# Altium footprint library custom-case.PcbLib: 380 footprints (part 1 of 24)
Each footprint in its own frame and in the unit in brackets; x right, y up, seen from the top. Pads: shape width x height; smd on the part's side, far side on the other; paste and mask are expansions set on the pad; w line width, h text height; cw(c..) or ccw(c..) is an arc to the next point about the centre after c.
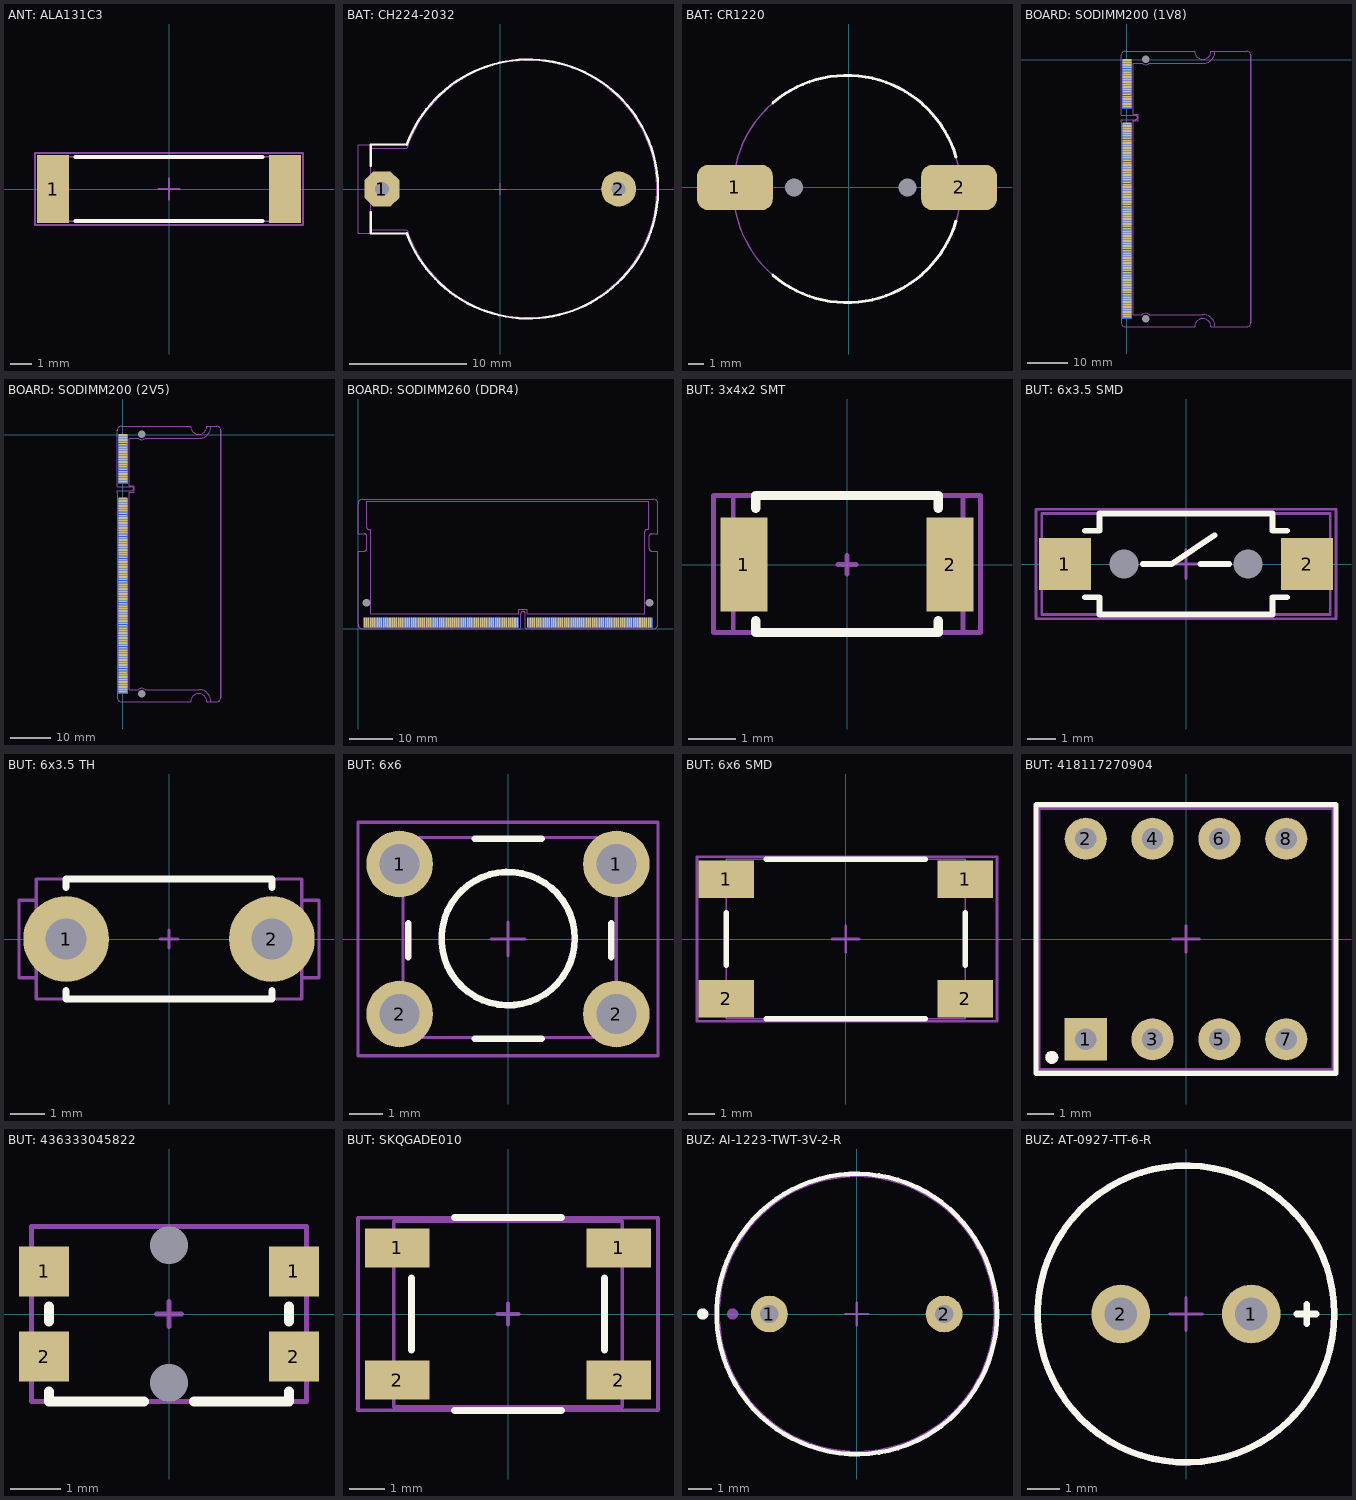
[diagram p0: the footprints below, top view; thin cyan lines are the x and y axes]

## ANT: ALA131C3 [mm]
pads (2):
  rect 1.5x3.2 smd: 1(-5.45,0) ""(5.45,0)
Top Overlay:
  lines w0.2: -4.4,-1.5 4.4,-1.5 ; -4.4,1.5 4.4,1.5
Top Assy:
  lines w0.1: -5.5,-1.525 5.5,-1.5 5.5,1.525 -5.5,1.5 -5.5,-1.525
Size Area:
  lines w0.1: -0.5,0 0.5,0 ; 0,-0.5 0,0.5 ; -6.3,-1.7 6.3,-1.7 6.3,1.7 -6.3,1.7 -6.3,-1.7
3D body "Antenna ALA131C3.STEP": height 1.22, standoff -0.02, extent -5.5,-1.52 5.5,1.52

## BAT: CH224-2032 [mm] "пїЅпїЅпїЅпїЅпїЅпїЅпїЅпїЅпїЅпїЅ пїЅпїЅпїЅпїЅпїЅ пїЅпїЅпїЅ пїЅпїЅпїЅпїЅпїЅпїЅпїЅпїЅ 2032"
height 9
pads (2):
  oct 3x3 hole 1.2: 1(-10.151,0)
  round 3 hole 1.2: 2(10.152,0)
Top Overlay:
  lines w0.2: -11.1,-2 -11.1,-3.81 -8.01,-3.81 ; -11.1,2 -11.1,3.81 -8.025,3.81 ; -8.01,-3.794 ccw(c2.422,0) -8.007,3.803
Top Assy:
  lines w0.1: -7.992,-3.5 -11.1,-3.5 -11.1,3.5 -7.992,3.5 ; -7.989,-3.552 ccw(c2.422,0) -7.989,3.552
Size Area:
  lines w0.1: -8.255,-3.81 -12.192,-3.81 -12.192,3.81 -8.255,3.81 ; -8.01,3.794 cw(c2.422,0) -8.005,-3.808 ; -0.5,0 0.5,0 ; 0,-0.5 0,0.5
3D body "CH224-2032.step": height 8.5, standoff -4, extent -11.079,-11 13.421,11

## BAT: CR1220 [mm]
pads (4):
  rrect50% 5x3 smd mask+0.075: 1(-7.5,0) 2(7.3,0)
  round 0 hole 1.2 mask+0.075: MH(-3.6,0) MH(3.9,0)
Top Overlay:
  lines w0.2: -4.997,-5.781 ccw(c-0.1,-0.1) 7.1,-2.2 ; -4.997,5.581 cw(c-0.1,-0.1) 7.1,2
Top Assy:
  lines w0.1: -5.002,-5.776 cw(c-0.1,-0.1) -4.997,-5.781
3D body "User Library-CR1220-2.STEP": height 3.6, standoff 1.6, extent -6.175,-6.175 6.225,6.225
3D body "ALSRobot-CR1220.STEP": height 4.04, standoff -0.9, extent -9.35,-7.6 9.15,7.397

## BOARD: SODIMM200 (1V8) [mm]
pads (202):
  rect 2.3x0.45 smd: 1(0,0) 3(0,-0.6) 5(0,-1.2) 7(0,-1.8) 9(0,-2.4) 11(0,-3) 13(0,-3.6) 15(0,-4.2) 17(0,-4.8) 19(0,-5.4) 21(0,-6) 23(0,-6.6) 25(0,-7.2) 27(0,-7.8) 29(0,-8.4) 31(0,-9) 33(0,-9.6) 35(0,-10.2) 37(0,-10.8) 39(0,-11.4) 41(0,-15.6) 43(0,-16.2) 45(0,-16.8) 47(0,-17.4) 49(0,-18) 51(0,-18.6) 53(0,-19.2) 55(0,-19.8) 57(0,-20.4) 59(0,-21) 61(0,-21.6) 63(0,-22.2) 65(0,-22.8) 67(0,-23.4) 69(0,-24) 71(0,-24.6) 73(0,-25.2) 75(0,-25.8) 77(0,-26.4) 79(0,-27) 81(0,-27.6) 83(0,-28.2) 85(0,-28.8) 87(0,-29.4) 89(0,-30) 91(0,-30.6) 93(0,-31.2) 95(0,-31.8) 97(0,-32.4) 99(0,-33) 101(0,-33.6) 103(0,-34.2) 105(0,-34.8) 107(0,-35.4) 109(0,-36) 111(0,-36.6) 113(0,-37.2) 115(0,-37.8) 117(0,-38.4) 119(0,-39) 121(0,-39.6) 123(0,-40.2) 125(0,-40.8) 127(0,-41.4) 129(0,-42) 131(0,-42.6) 133(0,-43.2) 135(0,-43.8) 137(0,-44.4) 139(0,-45) 141(0,-45.6) 143(0,-46.2) 145(0,-46.8) 147(0,-47.4) 149(0,-48) 151(0,-48.6) 153(0,-49.2) 155(0,-49.8) 157(0,-50.4) 159(0,-51) 161(0,-51.6) 163(0,-52.2) 165(0,-52.8) 167(0,-53.4) 169(0,-54) 171(0,-54.6) 173(0,-55.2) 175(0,-55.8) 177(0,-56.4) 179(0,-57) 181(0,-57.6) 183(0,-58.2) 185(0,-58.8) 187(0,-59.4) 189(0,-60) 191(0,-60.6) 193(0,-61.2) 195(0,-61.8) 197(0,-62.4) 199(0,-63)
  rect 2.3x0.45 smd far side: 2(0,-0.3) 4(0,-0.9) 6(0,-1.5) 8(0,-2.1) 10(0,-2.7) 12(0,-3.3) 14(0,-3.9) 16(0,-4.5) 18(0,-5.1) 20(0,-5.7) 22(0,-6.3) 24(0,-6.9) 26(0,-7.5) 28(0,-8.1) 30(0,-8.7) 32(0,-9.3) 34(0,-9.9) 36(0,-10.5) 38(0,-11.1) 40(0,-11.7) 42(0,-15.9) 44(0,-16.5) 46(0,-17.1) 48(0,-17.7) 50(0,-18.3) 52(0,-18.9) 54(0,-19.5) 56(0,-20.1) 58(0,-20.7) 60(0,-21.3) 62(0,-21.9) 64(0,-22.5) 66(0,-23.1) 68(0,-23.7) 70(0,-24.3) 72(0,-24.9) 74(0,-25.5) 76(0,-26.1) 78(0,-26.7) 80(0,-27.3) 82(0,-27.9) 84(0,-28.5) 86(0,-29.1) 88(0,-29.7) 90(0,-30.3) 92(0,-30.9) 94(0,-31.5) 96(0,-32.1) 98(0,-32.7) 100(0,-33.3) 102(0,-33.9) 104(0,-34.5) 106(0,-35.1) 108(0,-35.7) 110(0,-36.3) 112(0,-36.9) 114(0,-37.5) 116(0,-38.1) 118(0,-38.7) 120(0,-39.3) 122(0,-39.9) 124(0,-40.5) 126(0,-41.1) 128(0,-41.7) 130(0,-42.3) 132(0,-42.9) 134(0,-43.5) 136(0,-44.1) 138(0,-44.7) 140(0,-45.3) 142(0,-45.9) 144(0,-46.5) 146(0,-47.1) 148(0,-47.7) 150(0,-48.3) 152(0,-48.9) 154(0,-49.5) 156(0,-50.1) 158(0,-50.7) 160(0,-51.3) 162(0,-51.9) 164(0,-52.5) 166(0,-53.1) 168(0,-53.7) 170(0,-54.3) 172(0,-54.9) 174(0,-55.5) 176(0,-56.1) 178(0,-56.7) 180(0,-57.3) 182(0,-57.9) 184(0,-58.5) 186(0,-59.1) 188(0,-59.7) 190(0,-60.3) 192(0,-60.9) 194(0,-61.5) 196(0,-62.1) 198(0,-62.7) 200(0,-63.3)
  round 0 hole 1.8 paste-1.8 mask+0.05: MH(4.6,-63.45) MH(4.6,0.15)
Top Assy:
  lines w0.1: 29.35,2.15 cw(c29.35,1.15) 30.35,1.15 ; 29.352,2.15 20.6,2.15 cw(c18.6,2.15) 18.6,0.15 cw(c18.6,2.15) 16.6,2.15 16.1,2.15 -0.4,2.15 ccw(c-0.4,1.15) -1.4,1.15 -1.4,-12.2 -1.4,-13.6 2.1,-13.6 cw(c2.1,-14.1) 2.6,-14.1 cw(c2.1,-14.1) 2.1,-14.6 -1.4,-14.6 -1.4,-15.1 -1.4,-64.45 ccw(c-0.4,-64.45) -0.4,-65.45 16.1,-65.45 16.6,-65.45 cw(c18.6,-65.45) 18.6,-63.45 cw(c18.6,-65.45) 20.6,-65.45 29.35,-65.45 ccw(c29.35,-64.45) 30.35,-64.45 ; 30.35,-64.454 30.35,1.153
  text "1V8" at 6.457,0.016 h2
Size Area:
  lines w0.1: 29.35,2.15 cw(c29.35,1.15) 30.35,1.15 30.35,-64.45 cw(c29.35,-64.45) 29.35,-65.45 21.6,-65.45 ccw(c18.6,-65.45) 18.6,-62.45 5.431,-62.45 ccw(c4.6,-63.45) 3.769,-62.45 1.5,-62.45 1.5,-14.9 2.8,-14.9 2.8,-13.3 1.5,-13.3 1.5,-0.85 3.769,-0.85 ccw(c4.6,0.15) 5.431,-0.85 18.6,-0.85 ccw(c18.6,2.15) 21.6,2.15 29.352,2.15

## BOARD: SODIMM200 (2V5) [mm]
pads (202):
  rect 2.3x0.45 smd: 1(0,0) 3(0,-0.6) 5(0,-1.2) 7(0,-1.8) 9(0,-2.4) 11(0,-3) 13(0,-3.6) 15(0,-4.2) 17(0,-4.8) 19(0,-5.4) 21(0,-6) 23(0,-6.6) 25(0,-7.2) 27(0,-7.8) 29(0,-8.4) 31(0,-9) 33(0,-9.6) 35(0,-10.2) 37(0,-10.8) 39(0,-11.4) 41(0,-15.6) 43(0,-16.2) 45(0,-16.8) 47(0,-17.4) 49(0,-18) 51(0,-18.6) 53(0,-19.2) 55(0,-19.8) 57(0,-20.4) 59(0,-21) 61(0,-21.6) 63(0,-22.2) 65(0,-22.8) 67(0,-23.4) 69(0,-24) 71(0,-24.6) 73(0,-25.2) 75(0,-25.8) 77(0,-26.4) 79(0,-27) 81(0,-27.6) 83(0,-28.2) 85(0,-28.8) 87(0,-29.4) 89(0,-30) 91(0,-30.6) 93(0,-31.2) 95(0,-31.8) 97(0,-32.4) 99(0,-33) 101(0,-33.6) 103(0,-34.2) 105(0,-34.8) 107(0,-35.4) 109(0,-36) 111(0,-36.6) 113(0,-37.2) 115(0,-37.8) 117(0,-38.4) 119(0,-39) 121(0,-39.6) 123(0,-40.2) 125(0,-40.8) 127(0,-41.4) 129(0,-42) 131(0,-42.6) 133(0,-43.2) 135(0,-43.8) 137(0,-44.4) 139(0,-45) 141(0,-45.6) 143(0,-46.2) 145(0,-46.8) 147(0,-47.4) 149(0,-48) 151(0,-48.6) 153(0,-49.2) 155(0,-49.8) 157(0,-50.4) 159(0,-51) 161(0,-51.6) 163(0,-52.2) 165(0,-52.8) 167(0,-53.4) 169(0,-54) 171(0,-54.6) 173(0,-55.2) 175(0,-55.8) 177(0,-56.4) 179(0,-57) 181(0,-57.6) 183(0,-58.2) 185(0,-58.8) 187(0,-59.4) 189(0,-60) 191(0,-60.6) 193(0,-61.2) 195(0,-61.8) 197(0,-62.4) 199(0,-63)
  rect 2.3x0.45 smd far side: 2(0,-0.3) 4(0,-0.9) 6(0,-1.5) 8(0,-2.1) 10(0,-2.7) 12(0,-3.3) 14(0,-3.9) 16(0,-4.5) 18(0,-5.1) 20(0,-5.7) 22(0,-6.3) 24(0,-6.9) 26(0,-7.5) 28(0,-8.1) 30(0,-8.7) 32(0,-9.3) 34(0,-9.9) 36(0,-10.5) 38(0,-11.1) 40(0,-11.7) 42(0,-15.9) 44(0,-16.5) 46(0,-17.1) 48(0,-17.7) 50(0,-18.3) 52(0,-18.9) 54(0,-19.5) 56(0,-20.1) 58(0,-20.7) 60(0,-21.3) 62(0,-21.9) 64(0,-22.5) 66(0,-23.1) 68(0,-23.7) 70(0,-24.3) 72(0,-24.9) 74(0,-25.5) 76(0,-26.1) 78(0,-26.7) 80(0,-27.3) 82(0,-27.9) 84(0,-28.5) 86(0,-29.1) 88(0,-29.7) 90(0,-30.3) 92(0,-30.9) 94(0,-31.5) 96(0,-32.1) 98(0,-32.7) 100(0,-33.3) 102(0,-33.9) 104(0,-34.5) 106(0,-35.1) 108(0,-35.7) 110(0,-36.3) 112(0,-36.9) 114(0,-37.5) 116(0,-38.1) 118(0,-38.7) 120(0,-39.3) 122(0,-39.9) 124(0,-40.5) 126(0,-41.1) 128(0,-41.7) 130(0,-42.3) 132(0,-42.9) 134(0,-43.5) 136(0,-44.1) 138(0,-44.7) 140(0,-45.3) 142(0,-45.9) 144(0,-46.5) 146(0,-47.1) 148(0,-47.7) 150(0,-48.3) 152(0,-48.9) 154(0,-49.5) 156(0,-50.1) 158(0,-50.7) 160(0,-51.3) 162(0,-51.9) 164(0,-52.5) 166(0,-53.1) 168(0,-53.7) 170(0,-54.3) 172(0,-54.9) 174(0,-55.5) 176(0,-56.1) 178(0,-56.7) 180(0,-57.3) 182(0,-57.9) 184(0,-58.5) 186(0,-59.1) 188(0,-59.7) 190(0,-60.3) 192(0,-60.9) 194(0,-61.5) 196(0,-62.1) 198(0,-62.7) 200(0,-63.3)
  round 0 hole 1.8 paste-1.8 mask+0.05: MH(4.6,-63.45) MH(4.6,0.15)
Top Assy:
  lines w0.1: 23,-65.45 ccw(c23,-64.45) 24,-64.45 24,1.15 ccw(c23,1.15) 23,2.15 ; 23.002,-65.45 20.6,-65.45 ccw(c18.6,-65.45) 18.6,-63.45 ccw(c18.6,-65.45) 16.6,-65.45 16.1,-65.45 -0.4,-65.45 cw(c-0.4,-64.45) -1.4,-64.45 -1.4,-14.2 -1.4,-13.7 2.1,-13.7 ccw(c2.1,-13.2) 2.6,-13.2 ccw(c2.1,-13.2) 2.1,-12.7 -1.4,-12.7 -1.4,-12.2 -1.4,1.15 cw(c-0.4,1.15) -0.4,2.15 16.1,2.15 16.6,2.15 ccw(c18.6,2.15) 18.6,0.15 ccw(c18.6,2.15) 20.6,2.15 23.002,2.15
  text "2V5" at 6.421,0.016 h2
Size Area:
  lines w0.1: 23,2.15 cw(c23,1.15) 24,1.15 24,-64.45 cw(c23,-64.45) 23,-65.45 21.6,-65.45 ccw(c18.6,-65.45) 18.6,-62.45 5.431,-62.45 ccw(c4.6,-63.45) 3.769,-62.45 1.5,-62.45 1.5,-14 2.8,-14 2.8,-12.4 1.5,-12.4 ; 23.002,2.15 21.6,2.15 cw(c18.6,2.15) 18.6,-0.85 5.431,-0.85 cw(c4.6,0.15) 3.769,-0.85 1.5,-0.85 1.5,-12.4 ; 1.5,-12.4 1.5,-12.4

## BOARD: SODIMM260 (DDR4) [mm]
pads (262):
  rect 0.35x2.3 smd mask+0.1: 1(1.425,1.4) 3(1.925,1.4) 5(2.425,1.4) 7(2.925,1.4) 9(3.425,1.4) 11(3.925,1.4) 13(4.425,1.4) 15(4.925,1.4) 17(5.425,1.4) 19(5.925,1.4) 21(6.425,1.4) 23(6.925,1.4) 25(7.425,1.4) 27(7.925,1.4) 29(8.425,1.4) 31(8.925,1.4) 33(9.425,1.4) 35(9.925,1.4) 37(10.425,1.4) 39(10.925,1.4) 41(11.425,1.4) 43(11.925,1.4) 45(12.425,1.4) 47(12.925,1.4) 49(13.425,1.4) 51(13.925,1.4) 53(14.425,1.4) 55(14.925,1.4) 57(15.425,1.4) 59(15.925,1.4) 61(16.425,1.4) 63(16.925,1.4) 65(17.425,1.4) 67(17.925,1.4) 69(18.425,1.4) 71(18.925,1.4) 73(19.425,1.4) 75(19.925,1.4) 77(20.425,1.4) 79(20.925,1.4) 81(21.425,1.4) 83(21.925,1.4) 85(22.425,1.4) 87(22.925,1.4) 89(23.425,1.4) 91(23.925,1.4) 93(24.425,1.4) 95(24.925,1.4) 97(25.425,1.4) 99(25.925,1.4) 101(26.425,1.4) 103(26.925,1.4) 105(27.425,1.4) 107(27.925,1.4) 109(28.425,1.4) 111(28.925,1.4) 113(29.425,1.4) 115(29.925,1.4) 117(30.425,1.4) 119(30.925,1.4) 121(31.425,1.4) 123(31.925,1.4) 125(32.425,1.4) 127(32.925,1.4) 129(33.425,1.4) 131(33.925,1.4) 133(34.425,1.4) 135(34.925,1.4) 137(35.425,1.4) 139(35.925,1.4) 141(36.425,1.4) 143(36.925,1.4) 145(39.425,1.4) 147(39.925,1.4) 149(40.425,1.4) 151(40.925,1.4) 153(41.425,1.4) 155(41.925,1.4) 157(42.425,1.4) 159(42.925,1.4) 161(43.425,1.4) 163(43.925,1.4) 165(44.425,1.4) 167(44.925,1.4) 169(45.425,1.4) 171(45.925,1.4) 173(46.425,1.4) 175(46.925,1.4) 177(47.425,1.4) 179(47.925,1.4) 181(48.425,1.4) 183(48.925,1.4) 185(49.425,1.4) 187(49.925,1.4) 189(50.425,1.4) 191(50.925,1.4) 193(51.425,1.4) 195(51.925,1.4) 197(52.425,1.4) 199(52.925,1.4) 201(53.425,1.4) 203(53.925,1.4) 205(54.425,1.4) 207(54.925,1.4) 209(55.425,1.4) 211(55.925,1.4) 213(56.425,1.4) 215(56.925,1.4) 217(57.425,1.4) 219(57.925,1.4) 221(58.425,1.4) 223(58.925,1.4) 225(59.425,1.4) 227(59.925,1.4) 229(60.425,1.4) 231(60.925,1.4) 233(61.425,1.4) 235(61.925,1.4) 237(62.425,1.4) 239(62.925,1.4) 241(63.425,1.4) 243(63.925,1.4) 245(64.425,1.4) 247(64.925,1.4) 249(65.425,1.4) 251(65.925,1.4) 253(66.425,1.4) 255(66.925,1.4) 257(67.425,1.4) 259(67.925,1.4)
  rect 0.35x2.3 smd far side mask+0.1: 2(1.675,1.4) 4(2.175,1.4) 6(2.675,1.4) 8(3.175,1.4) 10(3.675,1.4) 12(4.175,1.4) 14(4.675,1.4) 16(5.175,1.4) 18(5.675,1.4) 20(6.175,1.4) 22(6.675,1.4) 24(7.175,1.4) 26(7.675,1.4) 28(8.175,1.4) 30(8.675,1.4) 32(9.175,1.4) 34(9.675,1.4) 36(10.175,1.4) 38(10.675,1.4) 40(11.175,1.4) 42(11.675,1.4) 44(12.175,1.4) 46(12.675,1.4) 48(13.175,1.4) 50(13.675,1.4) 52(14.175,1.4) 54(14.675,1.4) 56(15.175,1.4) 58(15.675,1.4) 60(16.175,1.4) 62(16.675,1.4) 64(17.175,1.4) 66(17.675,1.4) 68(18.175,1.4) 70(18.675,1.4) 72(19.175,1.4) 74(19.675,1.4) 76(20.175,1.4) 78(20.675,1.4) 80(21.175,1.4) 82(21.675,1.4) 84(22.175,1.4) 86(22.675,1.4) 88(23.175,1.4) 90(23.675,1.4) 92(24.175,1.4) 94(24.675,1.4) 96(25.175,1.4) 98(25.675,1.4) 100(26.175,1.4) 102(26.675,1.4) 104(27.175,1.4) 106(27.675,1.4) 108(28.175,1.4) 110(28.675,1.4) 112(29.175,1.4) 114(29.675,1.4) 116(30.175,1.4) 118(30.675,1.4) 120(31.175,1.4) 122(31.675,1.4) 124(32.175,1.4) 126(32.675,1.4) 128(33.175,1.4) 130(33.675,1.4) 132(34.175,1.4) 134(34.675,1.4) 136(35.175,1.4) 138(35.675,1.4) 140(36.175,1.4) 142(36.675,1.4) 144(37.175,1.4) 146(39.675,1.4) 148(40.175,1.4) 150(40.675,1.4) 152(41.175,1.4) 154(41.675,1.4) 156(42.175,1.4) 158(42.675,1.4) 160(43.175,1.4) 162(43.675,1.4) 164(44.175,1.4) 166(44.675,1.4) 168(45.175,1.4) 170(45.675,1.4) 172(46.175,1.4) 174(46.675,1.4) 176(47.175,1.4) 178(47.675,1.4) 180(48.175,1.4) 182(48.675,1.4) 184(49.175,1.4) 186(49.675,1.4) 188(50.175,1.4) 190(50.675,1.4) 192(51.175,1.4) 194(51.675,1.4) 196(52.175,1.4) 198(52.675,1.4) 200(53.175,1.4) 202(53.675,1.4) 204(54.175,1.4) 206(54.675,1.4) 208(55.175,1.4) 210(55.675,1.4) 212(56.175,1.4) 214(56.675,1.4) 216(57.175,1.4) 218(57.675,1.4) 220(58.175,1.4) 222(58.675,1.4) 224(59.175,1.4) 226(59.675,1.4) 228(60.175,1.4) 230(60.675,1.4) 232(61.175,1.4) 234(61.675,1.4) 236(62.175,1.4) 238(62.675,1.4) 240(63.175,1.4) 242(63.675,1.4) 244(64.175,1.4) 246(64.675,1.4) 248(65.175,1.4) 250(65.675,1.4) 252(66.175,1.4) 254(66.675,1.4) 256(67.175,1.4) 258(67.675,1.4) 260(68.175,1.4)
  round 0 hole 1.8 mask+0.1: MH(2,6) MH(67.6,6)
Top Assy:
  lines w0.1: 0,1 ccw(c1,1) 1,0 37.6,0 37.8,0.2 37.8,3.5 cw(c38.3,3.5) 38.8,3.5 38.8,0.2 39,0 68.6,0 ccw(c68.6,1) 69.6,1 69.6,18 68.1,18 cw(c68.1,18.5) 67.6,18.5 67.6,21.5 cw(c68.1,21.5) 68.1,22 69.6,22 69.6,29 ccw(c68.6,29) 68.6,30 1,30 ccw(c1,29) 0,29 0,22 1.5,22 cw(c1.5,21.5) 2,21.5 2,18.5 cw(c1.5,18.5) 1.5,18 0,18 0,1
Size Area:
  lines w0.1: 2,23.5 ccw(c2.5,23.5) 2.5,23 cw(c2.5,22.5) 3,22.5 3,3.5 37.3,3.5 37.3,4.5 38.3,4.5 38.8,4.5 39.3,4.5 39.3,3.5 66.5,3.5 66.5,22.5 cw(c67,22.5) 67,23 ccw(c67,23.5) 67.5,23.5 67.5,29.5 2,29.5 2,23.5

## BUT: 3x4x2 SMT [mm]
pads (2):
  rect 1x2 smd: 1(-2.2,0) 2(2.2,0)
Top Overlay:
  lines w0.2: -1.95,-1.2 -1.95,-1.45 1.95,-1.45 1.95,-1.2 ; -1.95,1.2 -1.95,1.45 ; -1.95,1.475 1.95,1.475 ; 1.95,1.2 1.95,1.45
Top Assy:
  lines w0.1: -2.425,-1.45 2.475,-1.45 2.475,1.475 -2.425,1.475 -2.425,-1.45
Size Area:
  lines w0.1: -0.2,0 0.2,0 ; 0,-0.2 0,0.2 ; -2.85,-1.45 -2.85,1.475 2.85,1.475 2.85,-1.45 -2.85,-1.45
3D body "User Library-Pushbutton3x4x2.step": height 2, standoff 0, extent -2.45,-1.45 2.45,1.45

## BUT: 6x3.5 SMD [mm]
pads (4):
  rect 1.8x1.8 smd mask+0.075: 1(-4.2,0) 2(4.2,0)
  round 0 hole 1 mask+0.075: ""(-2.15,0) ""(2.15,0)
Top Overlay:
  lines w0.2: -3.5,-1.15 -3,-1.15 -3,-1.75 3,-1.75 3,-1.15 3.5,-1.15 ; -3.5,1.15 -3,1.15 -3,1.75 3,1.75 3,1.15 3.5,1.15 ; -1.5,0 -0.5,0 1,1 ; 0.5,0 1.5,0
Top Assy:
  lines w0.1: -1.5,0 -0.5,0 1,1 ; 0.5,0 1.25,0 ; -5,-1.75 5,-1.75 5,1.75 -5,1.75 -5,-1.75
Size Area:
  lines w0.1: -0.5,0 0.5,0 ; 0,-0.5 0,0.5 ; -5.2,-1.9 5.2,-1.9 5.2,1.9 -5.2,1.9 -5.2,-1.9
3D body "User Library-DTSMF-32.STEP": height 5.05, standoff 0, extent -5,-1.75 5,1.75

## BUT: 6x3.5 TH [mm]
pads (2):
  round 2.5 hole 1.2 mask+0.075: 1(-3,0) 2(3,0)
Top Overlay:
  lines w0.2: -3,-1.5 -3,-1.75 3,-1.75 ; -3,1.5 -3,1.75 3,1.75 ; 3,-1.7 3,-1.5 ; 3,1.5 3,1.7
Top Assy:
  lines w0.1: -3.875,-1.75 3.875,-1.75 3.875,1.75 -3.875,1.75 -3.875,-1.75
Size Area:
  lines w0.1: -0.25,0 0.25,0 ; 0,-0.25 0,0.25 ; -4.375,-1.125 -4.375,1.125 -3.875,1.125 -3.875,1.75 3.875,1.75 3.875,1.125 4.375,1.125 4.375,-1.125 3.875,-1.125 3.875,-1.75 -3.875,-1.75 -3.875,-1.125 -4.375,-1.125
3D body "User Library-DTS-32.STEP": height 5.1, standoff -3.41, extent -3.878,-1.75 3.878,1.75

## BUT: 6x6 [mm] "Leaded Tactile Button 6x6"
height 5
pads (4):
  round 2 hole 1.2: 1(-3.25,2.25) 1(3.25,2.25) 2(-3.25,-2.25) 2(3.25,-2.25)
Top Overlay:
  circle w0.2: c0.004,0.012 r2
  lines w0.2: -2.996,-0.544 -2.996,0.472 ; -0.996,-2.988 1.004,-2.988 ; -0.996,3.012 1.004,3.012 ; 3.1,-0.544 3.1,0.472
Top Assy:
  lines w0.1: -3.148,-2.957 -3.148,3.043 3.252,3.043 3.252,-2.957 -3.148,-2.957
Size Area:
  lines w0.1: -0.5,0 0.5,0 ; 0,-0.5 0,0.5 ; -4.5,-3.5 4.5,-3.5 4.5,3.5 -4.5,3.5 -4.5,-3.5
3D body "������_��������_6�6�1.STEP": height 4.5, standoff -0.9, extent -3.148,-2.957 3.252,3.043

## BUT: 6x6 SMD [mm] "Leaded Tactile Button 6x6"
height 9
pads (4):
  rect 2.1x1.4 smd: 1(-4.5,2.25) 1(4.5,2.25) 2(-4.5,-2.25) 2(4.5,-2.25)
Top Overlay:
  lines w0.2: -4.5,-1 -4.5,1 ; -3,-3 3,-3 ; -3,3 3,3 ; 4.5,-1 4.5,1
Top Assy:
  lines w0.05: -4.5,-3 4.5,-3 4.5,3 -4.5,3 -4.5,-3
Size Area:
  lines w0.1: -0.5,0 0.5,0 ; 0,-0.5 0,0.5 ; -5.6,-3.1 -5.6,3.1 5.7,3.1 5.7,-3.1 -5.6,-3.1
3D body "User Library-PTS645SL43SMTR92-LFS.STEP": height 4.3, standoff 0, extent -4.5,-3 4.5,3

## BUT: 418117270904 [mm]
pads (10):
  rect 1.6x1.6 hole 0.8: 1(-3.81,-3.81)
  round 1.6 hole 0.8: 2(-3.81,3.81) 3(-1.27,-3.81) 4(-1.27,3.81) 5(1.27,-3.81) 6(1.27,3.81) 7(3.81,-3.81) 8(3.81,3.81)
  round 0.5 on Mech1: ""(-5.1,-4.5)
  round 0.5 on Top Overlay: ""(-5.1,-4.5)
Top Overlay:
  lines w0.2: -5.7,-5.1 5.7,-5.1 5.7,5.1 -5.7,5.1 -5.7,-5.1
Top Assy:
  lines w0.1: -5.58,-4.95 5.58,-4.95 5.58,4.95 -5.58,4.95 -5.58,-4.95
Size Area:
  lines w0.1: -0.5,0 0.5,0 ; 0,-0.5 0,0.5 ; -5.7,-5.1 5.7,-5.1 5.7,5.1 -5.7,5.1 -5.7,-5.1
3D body "418117270904 (rev1).stp": height 6.9, standoff -3.65, extent -5.58,-4.95 5.58,4.95

## BUT: 436333045822 [mm]
pads (6):
  rect 1x1 smd: 1(-2.5,0.85) 1(2.5,0.85) 2(-2.5,-0.85) 2(2.5,-0.85)
  round 0 hole 0.75: MH(0,-1.375) MH(0,1.375)
Top Overlay:
  lines w0.2: -2.4,-1.55 -2.4,-1.75 -0.5,-1.75 ; -2.4,-0.15 -2.4,0.15 ; 0.5,-1.75 2.4,-1.75 2.4,-1.55 ; 2.4,-0.15 2.4,0.15
Top Assy:
  lines w0.1: -2.75,-1.75 2.75,-1.75 2.75,1.75 -2.75,1.75 -2.75,-1.75
Size Area:
  lines w0.1: -0.25,0 0.25,0 ; 0,-0.25 0,0.25 ; -2.75,-1.75 -2.75,1.75 2.75,1.75 2.75,-1.75 -2.75,-1.75
3D body "436333045822_Download_STP_436333045822_rev1.stp": height 1.65, standoff -0.5, extent -2.75,-1.75 2.75,2.75

## BUT: SKQGADE010 [mm]
pads (4):
  rect 1.8x1.1 smd: 1(-3.1,1.85) 1(3.1,1.85) 2(-3.1,-1.85) 2(3.1,-1.85)
Top Overlay:
  lines w0.2: -2.7,-1 -2.7,1 ; -1.5,-2.7 1.5,-2.7 ; -1.5,2.7 1.5,2.7 ; 2.7,-1 2.7,1
Top Assy:
  lines w0.1: -3.2,-2.6 3.2,-2.6 3.2,2.6 -3.2,2.6 -3.2,-2.6
Size Area:
  lines w0.1: -0.3,0 0.3,0 ; 0,-0.3 0,0.3 ; -4.2,-2.7 4.2,-2.7 4.2,2.7 -4.2,2.7 -4.2,-2.7
3D body "User Library-4x4_SMD_Switch.STEP": height 1.45, standoff -0.05, extent -3.2,-2.6 3.2,2.6

## BUZ: AI-1223-TWT-3V-2-R [mm]
pads (4):
  round 1.6 hole 0.8: 1(-3.8,0) 2(3.8,0)
  round 0.5 on Top Overlay: ""(-6.7,0)
  round 0.5 on Mech1: ""(-5.4,0)
Top Overlay:
  circle w0.2: c0,0 r6.1
Top Assy:
  circle w0.1: c0,0 r6
Size Area:
  circle w0.1: c0,0 r6
  lines w0.1: -0.5,0 0.5,0 ; 0,-0.5 0,0.5
3D body "AI-1223-TWT-3V-2-R.STEP": height 7.55, standoff -2, extent -6,-6 6,6

## BUZ: AT-0927-TT-6-R [mm]
pads (2):
  round 1.8 hole 1: 1(2,0) 2(-2,0)
Top Overlay:
  circle w0.2: c0,0 r4.55
  lines w0.2: 3.4,0 4,0 ; 3.7,-0.3 3.7,0.3
Top Assy:
  circle w0.1: c0,0 r4.5
  lines w0.1: 3.4,0 4,0 ; 3.7,-0.3 3.7,0.3
Size Area:
  circle w0.1: c0,0 r4.6
  lines w0.1: -0.5,0 0.5,0 ; 0,-0.5 0,0.5
3D body "AT-0927-TT-6-R.STEP": height 4.52, standoff -2.5, extent -4.5,-4.5 4.5,4.5